# Altium footprint library 3.22-杂项.PcbLib: 199 footprints (part 15 of 15)
Each footprint in its own frame and in the unit in brackets; x right, y up, seen from the top. Pads: shape width x height; smd on the part's side, far side on the other; paste and mask are expansions set on the pad; w line width, h text height; cw(c..) or ccw(c..) is an arc to the next point about the centre after c.
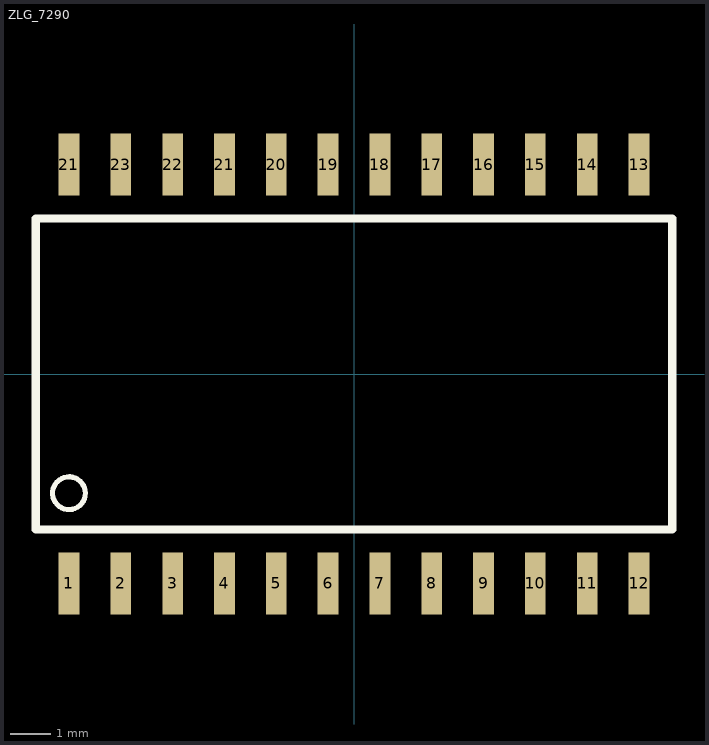
[diagram p14: the footprint, top view; thin cyan lines are the x and y axes]

## ZLG_7290 [mil] "[ PCBѧϰȺ514746572 ]"
height 104
pads (24):
  rect 20x60 smd: 1(-275,-202) 2(-225,-202) 3(-175,-202) 4(-125,-202) 5(-75,-202) 6(-25,-202) 7(25,-202) 8(75,-202) 9(125,-202) 10(175,-202) 11(225,-202) 12(275,-202) 13(275,202) 14(225,202) 15(175,202) 16(125,202) 17(75,202) 18(25,202) 19(-25,202) 20(-75,202) 21(-275,202) 21(-125,202) 22(-175,202) 23(-225,202)
Top Overlay:
  circle w5: c-275,-115 r15.81
  lines w8: -307,-150 307,-150 307,150 -307,150 -307,-150